# Altium footprint library 5-C-THD.PcbLib: 166 footprints (part 11 of 11)
Each footprint in its own frame and in the unit in brackets; x right, y up, seen from the top. Pads: shape width x height; smd on the part's side, far side on the other; paste and mask are expansions set on the pad; w line width, h text height; cw(c..) or ccw(c..) is an arc to the next point about the centre after c.
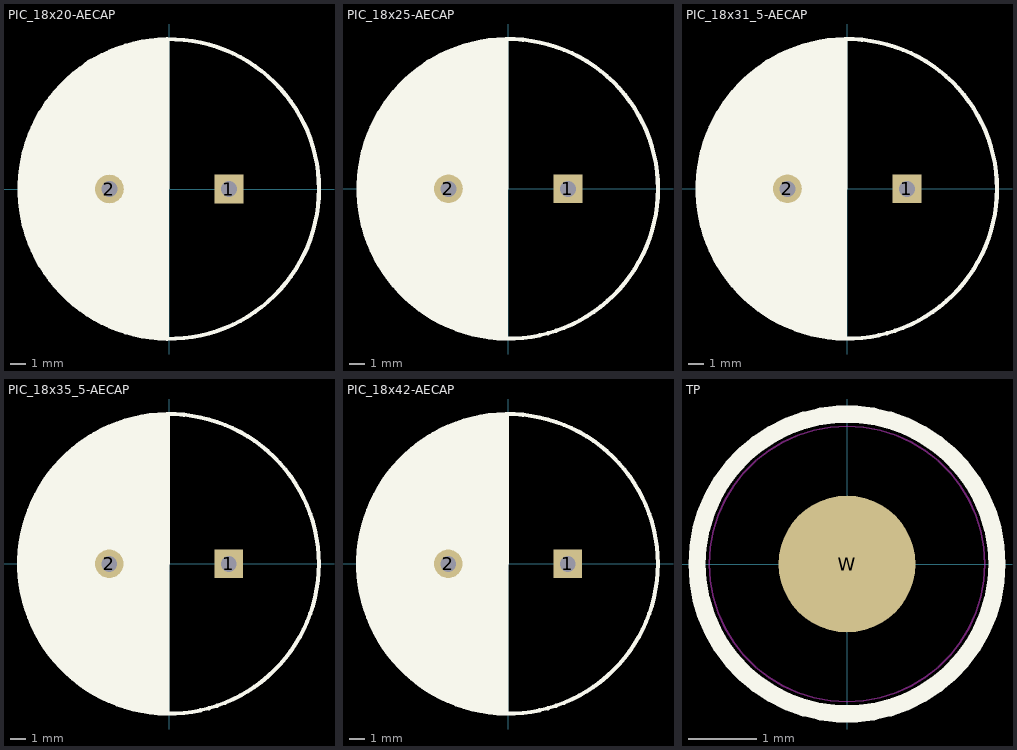
[diagram p10: the footprints below, top view; thin cyan lines are the x and y axes]

## PIC_18x20-AECAP [mm]
height 45
pads (2):
  rect 1.8x1.8 hole 1 mask+0.051: 1(3.75,0)
  round 1.8 hole 1 mask+0.051: 2(-3.75,0)
Top Overlay:
  circle w0.254: c0,0 r9.4
  region: -0.025,-9.398 -2.159,-9.119 -4.064,-8.534 -5.283,-7.772 -6.68,-6.756 -7.62,-5.512 -8.484,-3.962 -9.093,-2.616 -9.423,-0.559 -9.373,1.524 -8.763,3.556 -7.823,5.486 -6.502,6.858 -5.105,8.077 -3.581,8.788 -2.337,9.22 -0.787,9.373 0,9.373
3D body "pic_18x20-aecap.stp": height 20, standoff -1.91, extent -8.985,-8.99 9.04,9.01

## PIC_18x25-AECAP [mm]
height 45
pads (2):
  rect 1.8x1.8 hole 1 mask+0.051: 1(3.75,0)
  round 1.8 hole 1 mask+0.051: 2(-3.75,0)
Top Overlay:
  circle w0.254: c0,0 r9.4
  region: -0.025,-9.423 -2.159,-9.144 -4.064,-8.56 -5.283,-7.798 -6.68,-6.782 -7.62,-5.537 -8.484,-3.988 -9.093,-2.642 -9.423,-0.584 -9.373,1.499 -8.763,3.531 -7.823,5.461 -6.502,6.833 -5.105,8.052 -3.581,8.763 -2.337,9.195 -0.787,9.347 0,9.347
3D body "pic_18x25-aecap.stp": height 25, standoff -2.03, extent -8.993,-9.02 9.02,8.98

## PIC_18x31_5-AECAP [mm]
height 45
pads (2):
  rect 1.8x1.8 hole 1 mask+0.051: 1(3.75,0)
  round 1.8 hole 1 mask+0.051: 2(-3.75,0)
Top Overlay:
  circle w0.254: c0,0 r9.4
  region: -0.025,-9.423 -2.159,-9.144 -4.064,-8.56 -5.283,-7.798 -6.68,-6.782 -7.62,-5.537 -8.484,-3.988 -9.093,-2.642 -9.423,-0.584 -9.373,1.499 -8.763,3.531 -7.823,5.461 -6.502,6.833 -5.105,8.052 -3.581,8.763 -2.337,9.195 -0.787,9.347 0,9.347
3D body "pic_18x31_5-aecap.stp": height 31.5, standoff -1.92, extent -9.01,-8.99 9.02,9.01

## PIC_18x35_5-AECAP [mm]
height 45
pads (2):
  rect 1.8x1.8 hole 1 mask+0.051: 1(3.75,0)
  round 1.8 hole 1 mask+0.051: 2(-3.75,0)
Top Overlay:
  circle w0.254: c0,0 r9.4
  region: 0.025,-9.423 -2.108,-9.144 -4.013,-8.56 -5.232,-7.798 -6.629,-6.782 -7.569,-5.537 -8.433,-3.988 -9.042,-2.642 -9.373,-0.584 -9.322,1.499 -8.712,3.531 -7.772,5.461 -6.452,6.833 -5.055,8.052 -3.531,8.763 -2.286,9.195 -0.737,9.347 0.051,9.347
3D body "pic_18x35_5-aecap.stp": height 35.5, standoff -1.78, extent -9.055,-9 8.97,9

## PIC_18x42-AECAP [mm]
height 45
pads (2):
  rect 1.8x1.8 hole 1 mask+0.051: 1(3.75,0)
  round 1.8 hole 1 mask+0.051: 2(-3.75,0)
Top Overlay:
  circle w0.254: c0,0 r9.4
  region: 0.025,-9.423 -2.108,-9.144 -4.013,-8.56 -5.232,-7.798 -6.629,-6.782 -7.569,-5.537 -8.433,-3.988 -9.042,-2.642 -9.373,-0.584 -9.322,1.499 -8.712,3.531 -7.772,5.461 -6.452,6.833 -5.055,8.052 -3.531,8.763 -2.286,9.195 -0.737,9.347 0.051,9.347
3D body "pic_18x42-aecap.stp": height 42, standoff -1.91, extent -8.983,-9.02 9.02,8.98

## TP [mm]
height 11.7
pads (1):
  round 2 smd mask+1: W(0,0)
Top Overlay:
  circle w0.254: c0,0 r2.195
Keep-Out Layer:
  circle w0.025: c0,0 r2.017
3D body "1_016-1_016-3_tp.stp": height 0.02, standoff 0, extent -1.5,-1.5 1.5,1.5